# Altium footprint library XU-GENARAL PCB .PcbLib: 1176 footprints (part 3 of 75)
Each footprint in its own frame and in the unit in brackets; x right, y up, seen from the top. Pads: shape width x height; smd on the part's side, far side on the other; paste and mask are expansions set on the pad; w line width, h text height; cw(c..) or ccw(c..) is an arc to the next point about the centre after c.
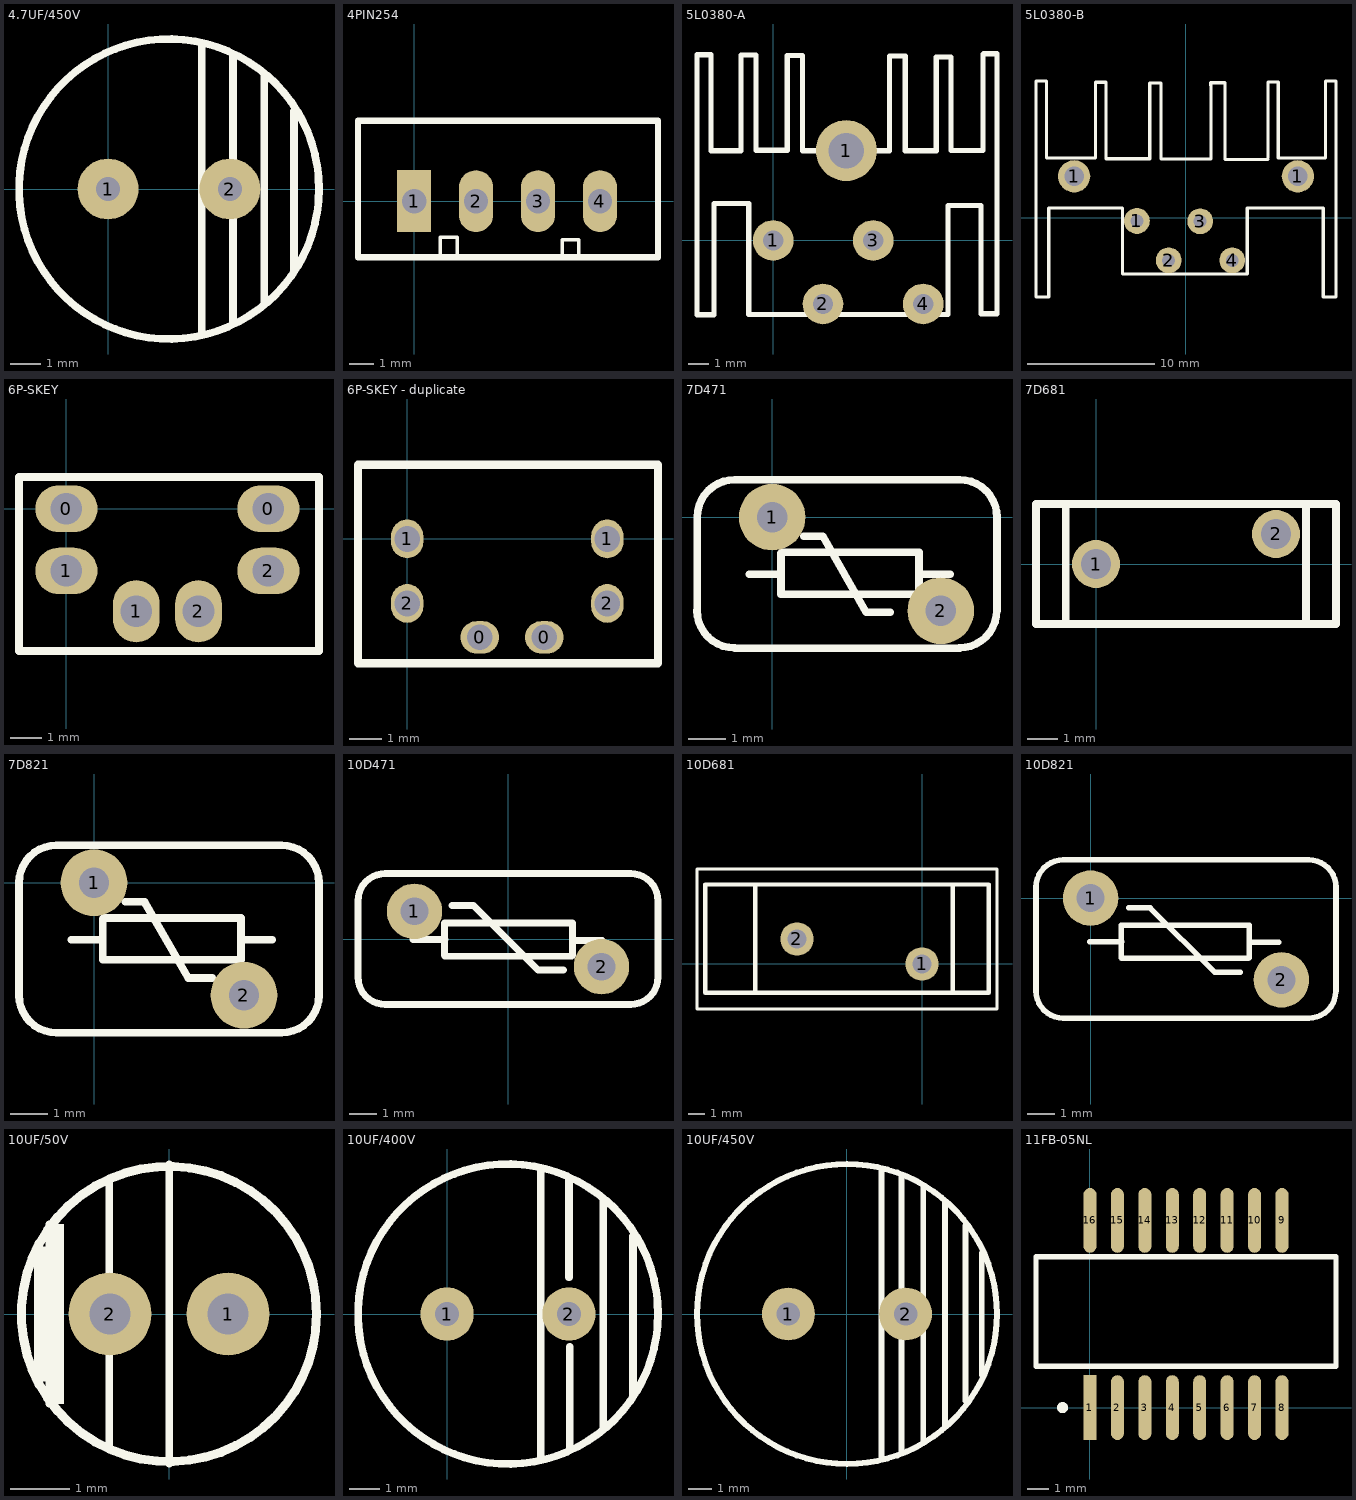
[diagram p2: the footprints below, top view; thin cyan lines are the x and y axes]

## 4.7UF/450V [mil]
pads (2):
  round 80 hole 32: 1(0,0) 2(160,0)
Top Overlay:
  circle w10: c80,0 r196.85
  lines w10: 123,-191 123,191 ; 164,-175 164,175 ; 205,-149 205,150 ; 244,-106 244,102

## 4PIN254 [mm]
pads (4):
  rect 1.4x2.54 hole 1: 1(0,0)
  oval 1.4x2.54 hole 1: 2(2.54,0) 3(5.08,0) 4(7.62,0)
Top Overlay:
  lines w0.152: 1.075,-2.25 1.075,-1.475 1.775,-1.475 1.775,-2.25 ; 6.075,-2.25 6.075,-1.575 6.75,-1.575 6.75,-2.275
  lines w0.254: -2.3,-2.3 -2.3,3.3 10,3.3 10,-2.3 -2.3,-2.3

## 5L0380-A [mil]
pads (5):
  round 80 hole 40: 1(0,0) 2(98,-125) 3(196.85,0) 4(295.28,-125)
  round 120 hole 70: 1(144,177)
Top Overlay:
  lines w10: -149.94,-146.26 -116.24,-146.26 -116.24,72.74 -48,72.74 -48,-146 344,-146 344,68.74 408.76,68.74 408.76,-144.26 415.91,-144.26 440.61,-144.26 440.61,367.55 413.72,367.55 412.94,366.78 412.94,176.78 349.72,176.78 349.72,360.78 320.94,360.78 320.94,176.55 259.94,176.55 259.94,362.78 228.94,362.78 228.94,176.55 57.72,176.55 57.72,363.78 27.72,363.78 27.72,177.55 -34.06,177.55 -34.06,364.78 -63.06,364.78 -63.06,176.55 -122.06,176.55 -122.06,365.55 -149.94,365.55 -149.94,-146.26

## 5L0380-B [mil]
pads (6):
  round 100 hole 60: 1(-346.46,128.24) 1(346.46,128.24)
  round 80 hole 40: 1(-152,-10.13) 2(-53.58,-132) 3(44,-11.13) 4(143.28,-132)
Top Overlay:
  lines w10: 252,181.87 254,179.87 121,179.87 121,417.87 77,417.87 77,409.16 77.65,408.52 77.65,181.52 -77.65,181.52 -77.65,417.52 -112.35,417.52 -112.35,182.22 -247.65,182.22 -247.65,419.22 -280.65,419.22 -280.65,184.52 -431.65,184.52 -431.65,423.52 -464.57,423.52 -464.57,-245.78 -425.2,-245.78 -425.2,29.82 -197,29.82 -197,-174 190,-174 190,29.82 425.2,29.82 425.2,-245.78 464.57,-245.78 464.57,423.52 431.65,423.52 431.65,185.22 285.65,185.22 285.65,420.22 285.29,419.87 254,419.87 254,185.87

## 6P-SKEY [mm]
pads (6):
  oval 2x1.5 hole 1.016: 0(0,0) 0(6.5,0) 1(0,-2) 2(6.5,-2)
  oval 1.5x2 hole 1.016: 1(2.25,-3.3) 2(4.25,-3.3)
Top Overlay:
  lines w0.254: -1.524,-4.572 -1.524,1.016 8.128,1.016 8.128,-4.572 -1.524,-4.572

## 6P-SKEY - duplicate [mm]
pads (6):
  oval 1.2x1 hole 0.8: 0(2.25,-3.05) 0(4.25,-3.05)
  oval 1x1.2 hole 0.8: 1(0,0) 1(6.2,0) 2(0,-2) 2(6.2,-2)
Top Overlay:
  lines w0.254: -1.524,2.21 -1.524,-3.856 7.772,-3.856 7.772,2.3 -1.524,2.3

## 7D471 [mil]
pads (2):
  round 70 hole 32: 1(0,0) 2(177.17,-98.43)
Top Overlay:
  lines w8: -79,-98 ccw(c-39.63,-98) -39.63,-137.37 ; -78.74,-98.43 -78.74,0 cw(c-39.37,0) -39.37,39.37 196.85,39.37 cw(c196.85,0) 236.22,0 236.22,-98.43 ; -39.37,-137.8 196.85,-137.8 ; -24,-60 9.27,-60 ; 9.27,-38 9.27,-81 154.27,-81 154.27,-37 10.27,-37 ; 33,-20 53,-20 99,-100 124,-100 ; 154.27,-60 187,-60 ; 196.63,-137.37 ccw(c196.63,-98) 236,-98

## 7D681 [mm]
pads (2):
  round 1.6 hole 1: 1(0,0) 2(6,1)
Top Overlay:
  lines w0.254: -1.007,-2 -1.007,2 ; 7,-2 7,2 ; -2,-2 -2,2 8,2 8,-2 -2,-2

## 7D821 [mil]
pads (2):
  round 70 hole 32: 1(0,0) 2(157.48,-118.11)
Top Overlay:
  lines w8: -24,-60 9.27,-60 ; 9.27,-38 9.27,-81 154.27,-81 154.27,-37 10.27,-37 ; 33,-20 53,-20 99,-100 124,-100 ; 154.27,-60 187,-60 ; -78.74,-118.11 ccw(c-39.37,-118.11) -39.37,-157.48 196.85,-157.48 ccw(c196.85,-118.11) 236.22,-118.11 236.22,0 ccw(c196.85,0) 196.85,39.37 -39.37,39.37 ccw(c-39.37,0) -78.74,0 -78.74,-118.11

## 10D471 [mil]
pads (2):
  round 80 hole 40: 1(-135,40) 2(135,-40)
Top Overlay:
  lines w10: -136.95,-0.94 -90.95,-0.94 ; -80.95,48.05 -49.95,48.05 43.05,-44.95 80.05,-44.95 ; 93.05,-1.95 136.05,-1.95 ; -216.54,-55.12 ccw(c-177.17,-55.12) -177.17,-94.49 177.17,-94.49 ccw(c177.17,-55.12) 216.54,-55.12 216.54,55.12 ccw(c177.17,55.12) 177.17,94.49 -177.16,94.49 ccw(c-177.17,55.12) -216.54,55.12 -216.54,-55.12 ; -91.95,-23.95 -90.95,-24.95 92.05,-24.95 93.05,-23.95 93.05,23.05 -91.95,23.05 -91.95,-23.95

## 10D681 [mm]
pads (2):
  round 2 hole 1.143: 1(0,0) 2(-7.5,1.5)
Top Overlay:
  lines w0.203: -13.5,-2.701 4.5,-2.701 4.5,5.699 -13.5,5.699 -13.5,-2.701
  lines w0.254: -10,-1.726 -10,4.774 ; 1.84,-1.726 4,-1.726 4,4.774 1.84,4.774 ; 1.84,-1.726 -12.16,-1.726 -13,-1.726 -13,4.774 -12.16,4.774 1.84,4.774 ; 1.84,-1.726 1.84,4.774

## 10D821 [mil]
pads (2):
  round 80 hole 40: 1(0,0) 2(275.59,-118.11)
Top Overlay:
  lines w8: -1,-63 45,-63 ; 55,-14 86,-14 179,-107 216,-107 ; 229,-64 272,-64 ; 354,-135 cw(c315.37,-134.59) 314.96,-173.23 -39.37,-173.23 cw(c-39.37,-133.86) -78.74,-133.86 -78.74,15.75 cw(c-39.37,15.75) -39.37,55.12 314.96,55.12 cw(c314.96,15.75) 354.33,15.75 354.33,-133.86 ; 44,-86 44,-39 229,-39 229,-86 228,-87 45,-87 44,-86

## 10UF/50V [mm]
pads (2):
  round 1.4 hole 0.7: 1(1,0) 2(-1,0)
Top Overlay:
  circle w0.152: c0,0 r2.5
  rectangle: -2.032,-1.524 -1.778,1.524
  rectangle: -2.286,-1.143 -2.032,1.143
  rectangle: -1.016,-2.032 -1.016,2.032
  lines w0.127: -2.032,-1.524 -2.032,1.524 ; -1.016,-2.286 -1.016,-2.032 -1.016,2.032 -1.016,2.286 ; 0,-2.54 0,2.54

## 10UF/400V [mil]
pads (2):
  round 70 hole 32: 1(0,0) 2(160,0)
Top Overlay:
  circle w10: c80,0 r196.85
  lines w10: 123,-191 123,191 ; 160,48 160,175 ; 161,-176 161,-43 ; 205,-149 205,150 ; 244,-106 244,102

## 10UF/450V [mil]
pads (2):
  round 90 hole 40: 1(-100,0) 2(100,0)
Top Overlay:
  circle w10: c0,0 r255.91
  lines w10: 59,-245 59,244 ; 93,-238 93,236 ; 130,-220 130,219 ; 167,-191 167,191 ; 202,-148 202,151 ; 230,-104 230,104

## 11FB-05NL [mm]
pads (16):
  rect 0.6x3 smd: 1(0,0)
  oval 0.6x3 smd: 2(1.27,0) 3(2.54,0) 4(3.81,0) 5(5.08,0) 6(6.35,0) 7(7.62,0) 8(8.89,0) 9(8.89,8.67) 10(7.62,8.67) 11(6.35,8.67) 12(5.08,8.67) 13(3.81,8.67) 14(2.54,8.67) 15(1.27,8.67) 16(0,8.67)
Top Overlay:
  circle w0.254: c-1.27,0 r0.127
  lines w0.254: -2.5,1.905 11.39,1.905 11.39,6.985 -2.5,6.985 -2.5,1.985